# Altium footprint library QFP_LQFP_TQFP.PcbLib: 18 footprints (part 2 of 2)
Each footprint in its own frame and in the unit in brackets; x right, y up, seen from the top. Pads: shape width x height; smd on the part's side, far side on the other; paste and mask are expansions set on the pad; w line width, h text height; cw(c..) or ccw(c..) is an arc to the next point about the centre after c.
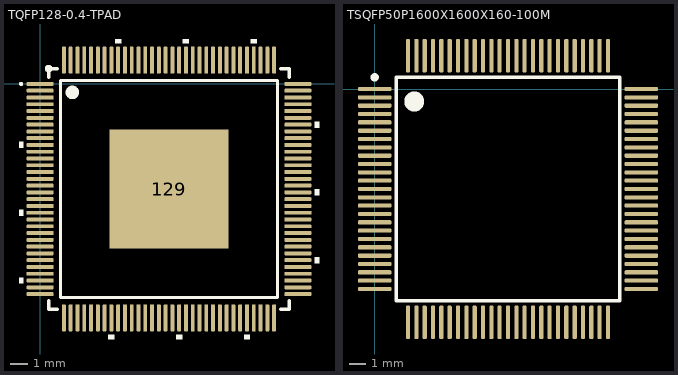
[diagram p1: the footprints below, top view; thin cyan lines are the x and y axes]

## TQFP128-0.4-TPAD [mm] "QFP; 128 Leads; Body 14 x 14 mm; Pitch 0.4 mm"
height 2.2
pads (129):
  rrect50% 1.6x0.23 smd: 1(0,0) 2(0,-0.4) 3(0,-0.8) 4(0,-1.2) 5(0,-1.6) 6(0,-2) 7(0,-2.4) 8(0,-2.8) 9(0,-3.2) 10(0,-3.6) 11(0,-4) 12(0,-4.4) 13(0,-4.8) 14(0,-5.2) 15(0,-5.6) 16(0,-6) 17(0,-6.4) 18(0,-6.8) 19(0,-7.2) 20(0,-7.6) 21(0,-8) 22(0,-8.4) 23(0,-8.8) 24(0,-9.2) 25(0,-9.6) 26(0,-10) 27(0,-10.4) 28(0,-10.8) 29(0,-11.2) 30(0,-11.6) 31(0,-12) 32(0,-12.4) 65(15.2,-12.4) 66(15.2,-12) 67(15.2,-11.6) 68(15.2,-11.2) 69(15.2,-10.8) 70(15.2,-10.4) 71(15.2,-10) 72(15.2,-9.6) 73(15.2,-9.2) 74(15.2,-8.8) 75(15.2,-8.4) 76(15.2,-8) 77(15.2,-7.6) 78(15.2,-7.2) 79(15.2,-6.8) 80(15.2,-6.4) 81(15.2,-6) 82(15.2,-5.6) 83(15.2,-5.2) 84(15.2,-4.8) 85(15.2,-4.4) 86(15.2,-4) 87(15.2,-3.6) 88(15.2,-3.2) 89(15.2,-2.8) 90(15.2,-2.4) 91(15.2,-2) 92(15.2,-1.6) 93(15.2,-1.2) 94(15.2,-0.8) 95(15.2,-0.4) 96(15.2,0)
  rrect50% 0.23x1.6 smd: 33(1.4,-13.8) 34(1.8,-13.8) 35(2.2,-13.8) 36(2.6,-13.8) 37(3,-13.8) 38(3.4,-13.8) 39(3.8,-13.8) 40(4.2,-13.8) 41(4.6,-13.8) 42(5,-13.8) 43(5.4,-13.8) 44(5.8,-13.8) 45(6.2,-13.8) 46(6.6,-13.8) 47(7,-13.8) 48(7.4,-13.8) 49(7.8,-13.8) 50(8.2,-13.8) 51(8.6,-13.8) 52(9,-13.8) 53(9.4,-13.8) 54(9.8,-13.8) 55(10.2,-13.8) 56(10.6,-13.8) 57(11,-13.8) 58(11.4,-13.8) 59(11.8,-13.8) 60(12.2,-13.8) 61(12.6,-13.8) 62(13,-13.8) 63(13.4,-13.8) 64(13.8,-13.8) 97(13.8,1.4) 98(13.4,1.4) 99(13,1.4) 100(12.6,1.4) 101(12.2,1.4) 102(11.8,1.4) 103(11.4,1.4) 104(11,1.4) 105(10.6,1.4) 106(10.2,1.4) 107(9.8,1.4) 108(9.4,1.4) 109(9,1.4) 110(8.6,1.4) 111(8.2,1.4) 112(7.8,1.4) 113(7.4,1.4) 114(7,1.4) 115(6.6,1.4) 116(6.2,1.4) 117(5.8,1.4) 118(5.4,1.4) 119(5,1.4) 120(4.6,1.4) 121(4.2,1.4) 122(3.8,1.4) 123(3.4,1.4) 124(3,1.4) 125(2.6,1.4) 126(2.2,1.4) 127(1.8,1.4) 128(1.4,1.4)
  rect 7x7 smd: 129(7.6,-6.2)
Top Overlay:
  circle w0.15: c-1.125,0 r0.05
  circle w0.4: c1.9,-0.5 r0.2
  circle w0.203: c0.5,0.9 r0.125
  region: 4.775,2.399 4.775,2.649 4.425,2.649 4.425,2.399
  region: 8.775,2.399 8.775,2.649 8.425,2.649 8.425,2.399
  region: 12.775,2.399 12.775,2.649 12.425,2.649 12.425,2.399
  region: 16.199,-2.575 16.449,-2.575 16.449,-2.225 16.199,-2.225
  region: 16.199,-6.575 16.449,-6.575 16.449,-6.225 16.199,-6.225
  region: 16.199,-10.575 16.449,-10.575 16.449,-10.225 16.199,-10.225
  region: 12.025,-14.799 12.025,-15.049 12.375,-15.049 12.375,-14.799
  region: 8.025,-14.799 8.025,-15.049 8.375,-15.049 8.375,-14.799
  region: 4.025,-14.799 4.025,-15.049 4.375,-15.049 4.375,-14.799
  region: -0.999,-11.425 -1.249,-11.425 -1.249,-11.775 -0.999,-11.775
  region: -0.999,-7.425 -1.249,-7.425 -1.249,-7.775 -0.999,-7.775
  region: -0.999,-3.425 -1.249,-3.425 -1.249,-3.775 -0.999,-3.775
  lines w0.2: 0.5,-12.8 0.5,-13.3 1,-13.3 ; 0.5,0.4 0.5,0.9 1,0.9 ; 14.2,-13.3 14.7,-13.3 14.7,-12.8 ; 14.2,0.9 14.7,0.9 14.7,0.4
  lines w0.203: 1.2,-12.6 1.2,0.2 14,0.2 14,-12.6 1.2,-12.6
Top Assembly:
  text ".Designator" at 2.502,-6.733 h1
3D body "User Library-IPC QFP-full.STEP": height 1.35, standoff 0, extent -0.41,-14.212 15.612,1.81

## TSQFP50P1600X1600X160-100M [mm] "TSQFP, 100-Leads, Body 16,0x16,0mm (max), Pitch 0,50mm, IPC Low Density"
height 1.6
pads (100):
  rrect50% 2x0.25 smd: 1(0,0) 2(0,-0.5) 3(0,-1) 4(0,-1.5) 5(0,-2) 6(0,-2.5) 7(0,-3) 8(0,-3.5) 9(0,-4) 10(0,-4.5) 11(0,-5) 12(0,-5.5) 13(0,-6) 14(0,-6.5) 15(0,-7) 16(0,-7.5) 17(0,-8) 18(0,-8.5) 19(0,-9) 20(0,-9.5) 21(0,-10) 22(0,-10.5) 23(0,-11) 24(0,-11.5) 25(0,-12) 51(16,-12) 52(16,-11.5) 53(16,-11) 54(16,-10.5) 55(16,-10) 56(16,-9.5) 57(16,-9) 58(16,-8.5) 59(16,-8) 60(16,-7.5) 61(16,-7) 62(16,-6.5) 63(16,-6) 64(16,-5.5) 65(16,-5) 66(16,-4.5) 67(16,-4) 68(16,-3.5) 69(16,-3) 70(16,-2.5) 71(16,-2) 72(16,-1.5) 73(16,-1) 74(16,-0.5) 75(16,0)
  rrect50% 0.25x2 smd: 26(2,-14) 27(2.5,-14) 28(3,-14) 29(3.5,-14) 30(4,-14) 31(4.5,-14) 32(5,-14) 33(5.5,-14) 34(6,-14) 35(6.5,-14) 36(7,-14) 37(7.5,-14) 38(8,-14) 39(8.5,-14) 40(9,-14) 41(9.5,-14) 42(10,-14) 43(10.5,-14) 44(11,-14) 45(11.5,-14) 46(12,-14) 47(12.5,-14) 48(13,-14) 49(13.5,-14) 50(14,-14) 76(14,2) 77(13.5,2) 78(13,2) 79(12.5,2) 80(12,2) 81(11.5,2) 82(11,2) 83(10.5,2) 84(10,2) 85(9.5,2) 86(9,2) 87(8.5,2) 88(8,2) 89(7.5,2) 90(7,2) 91(6.5,2) 92(6,2) 93(5.5,2) 94(5,2) 95(4.5,2) 96(4,2) 97(3.5,2) 98(3,2) 99(2.5,2) 100(2,2)
Top Overlay:
  circle w0.25: c0,0.7 r0.125
  circle w0.6: c2.375,-0.75 r0.3
  lines w0.2: 1.3,-12.7 1.3,0.7 14.7,0.7 14.7,-12.7 1.3,-12.7
Top Assembly:
  text ".Designator" at 3.002,-6.633 h1
3D body "User Library-TQFP100_Grid_0_5.STEP": height 1.2, standoff 0, extent 0,-14 16,2